# Altium footprint library Hare_Library.PcbLib: 252 footprints (part 10 of 16)
Each footprint in its own frame and in the unit in brackets; x right, y up, seen from the top. Pads: shape width x height; smd on the part's side, far side on the other; paste and mask are expansions set on the pad; w line width, h text height; cw(c..) or ccw(c..) is an arc to the next point about the centre after c.
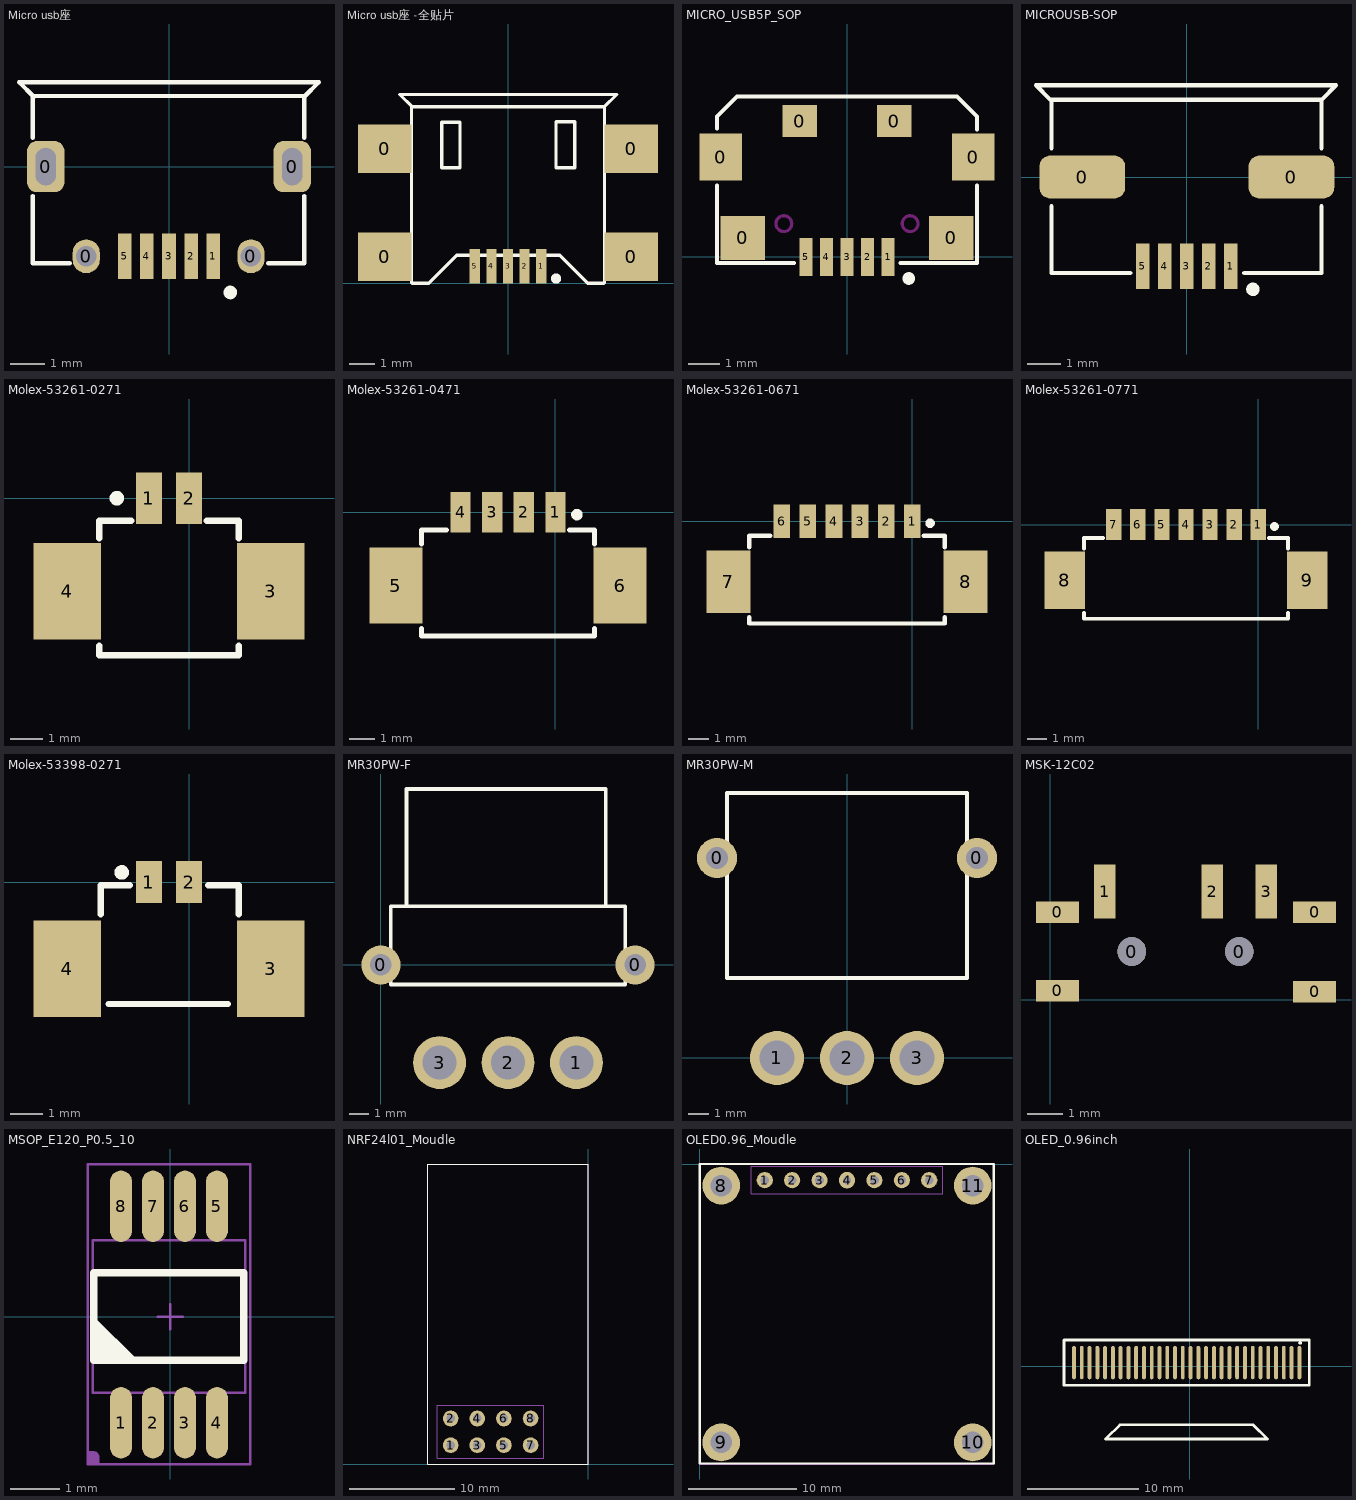
[diagram p9: the footprints below, top view; thin cyan lines are the x and y axes]

## Micro usb座 [mm] "Micro usb座 5pin"
pads (9):
  rrect50% 1.1x1.5 hole 0.6 slot 1.1 at 90 deg: 0(-3.632,0) 0(3.632,0)
  oval 0.8x1 hole 0.6: 0(-2.438,-2.642) 0(2.413,-2.642)
  rect 0.4x1.35 smd: 1(1.3,-2.642) 2(0.65,-2.642) 3(0,-2.642) 4(-0.65,-2.642) 5(-1.3,-2.642)
Top Overlay:
  circle w0.2: c1.805,-3.708 r0.1
  lines w0.127: -4.013,-0.864 -4.013,-2.845 -2.921,-2.845 ; -4.013,0.851 -4.013,2.083 -2.438,2.083 ; -3.988,2.057 -4.42,2.489 4.42,2.489 3.988,2.057 ; -3.988,2.083 3.988,2.083 3.988,0.851 ; 2.921,-2.845 3.988,-2.845 3.988,-0.864

## Micro usb座 -全贴片 [mm]
pads (9):
  rect 2.1x1.9 smd: 0(-4.826,1.041) 0(-4.826,5.258) 0(4.826,1.041) 0(4.826,5.258)
  rect 0.4x1.35 smd: 1(1.3,0.66) 2(0.65,0.66) 3(0,0.66) 4(-0.65,0.66) 5(-1.3,0.66)
Top Overlay:
  circle w0.2: c1.881,0.178 r0.1
  lines w0.127: -3.759,6.909 -4.242,7.391 4.267,7.391 3.759,6.883 ; -3.785,0.025 -3.785,6.909 3.785,6.909 3.785,0.025 3.759,0 3.124,0 2.032,1.092 -2.007,1.092 -3.099,0 -3.124,0 -3.759,0 -3.785,0.025 ; -2.591,4.521 -1.88,4.521 -1.88,6.299 -2.591,6.299 -2.591,4.521 ; 1.88,4.521 1.88,6.325 2.616,6.325 2.616,4.521 1.88,4.521

## MICRO_USB5P_SOP [mm]
pads (11):
  rect 1.35x1.5 smd: 0(-4,3.16) 0(4,3.16)
  rect 1.4x1.4 smd: 0(-3.3,0.6) 0(3.3,0.6)
  rect 1.1x1 smd: 0(-1.5,4.3) 0(1.5,4.3)
  rect 0.4x1.2 smd: 1(1.3,0) 2(0.65,0) 3(0,0) 4(-0.65,0) 5(-1.3,0)
Top Overlay:
  circle w0.2: c1.957,-0.686 r0.1
  lines w0.127: -4.115,2.261 -4.115,-0.203 -1.676,-0.203 ; -4.115,4.064 -4.115,4.445 -3.48,5.08 3.48,5.08 4.115,4.445 4.115,4.039 ; 1.702,-0.203 4.115,-0.203 4.115,2.261
Keep-Out Layer:
  circle w0.1: c-2,1.05 r0.25
  circle w0.1: c2,1.05 r0.25

## MICROUSB-SOP [mm]
pads (7):
  rrect50% 2.54x1.27 smd: 0(-3.099,0) 0(3.099,0)
  rect 0.4x1.35 smd: 1(1.3,-2.642) 2(0.65,-2.642) 3(0,-2.642) 4(-0.65,-2.642) 5(-1.3,-2.642)
Top Overlay:
  circle w0.2: c1.957,-3.327 r0.1
  lines w0.127: -4.013,-0.864 -4.013,-2.845 -1.676,-2.845 ; -4.013,0.851 -4.013,2.286 ; 1.702,-2.845 3.988,-2.845 3.988,-0.864 ; 3.988,0.851 3.988,2.286 ; 3.988,2.286 -4.039,2.286 -4.47,2.718 4.42,2.718 3.988,2.286

## Molex-53261-0271 [mm] "卧式1.25mm Pitch PicoBlade Header"
height 3.4
pads (4):
  rect 0.8x1.6 smd: 1(-1.25,0) 2(0,0)
  rect 2.1x3 smd: 3(2.55,-2.9) 4(-3.8,-2.9)
Top Overlay:
  circle w0.254: c-2.25,0 r0.1
  lines w0.2: -2.8,-4.6 -2.8,-4.9 1.55,-4.9 1.55,-4.6 ; -2.8,-1.25 -2.8,-0.7 -1.8,-0.7 ; 0.55,-0.7 1.55,-0.7 1.55,-1.25
3D body "MOLEX-53261-0271.stp": height 3.4, standoff 0, extent -4.46,-4.912 3.19,0.288

## Molex-53261-0471 [mm] "卧式1.25mm Pitch PicoBlade Header"
height 3.4
pads (6):
  rect 0.8x1.6 smd: 1(0,0) 2(-1.25,0) 3(-2.5,0) 4(-3.75,0)
  rect 2.1x3 smd: 5(-6.3,-2.9) 6(2.55,-2.9)
Top Overlay:
  circle w0.254: c0.85,-0.1 r0.1
  lines w0.2: -5.3,-4.6 -5.3,-4.9 1.55,-4.9 1.55,-4.6 ; -5.3,-1.25 -5.3,-0.7 -4.3,-0.7 ; 0.55,-0.7 1.55,-0.7 1.55,-1.25
3D body "MOLEX-53261-0471.stp": height 3.4, standoff 0, extent -6.975,-4.975 3.175,0.225

## Molex-53261-0671 [mm] "卧式1.25mm Pitch PicoBlade Header"
height 3.4
pads (8):
  rect 0.8x1.6 smd: 1(0,0) 2(-1.25,0) 3(-2.5,0) 4(-3.75,0) 5(-5,0) 6(-6.25,0)
  rect 2.1x3 smd: 7(-8.8,-2.9) 8(2.55,-2.9)
Top Overlay:
  circle w0.254: c0.85,-0.1 r0.1
  lines w0.2: -7.8,-4.6 -7.8,-4.9 1.55,-4.9 1.55,-4.6 ; -7.8,-1.25 -7.8,-0.7 -6.8,-0.7 ; 0.55,-0.7 1.55,-0.7 1.55,-1.25
3D body "MOLEX-53261-0671.stp": height 3.4, standoff 0, extent -9.449,-4.937 3.201,0.263

## Molex-53261-0771 [mm] "卧式1.25mm Pitch PicoBlade Header"
height 3.4
pads (9):
  rect 0.8x1.6 smd: 1(0,0) 2(-1.25,0) 3(-2.5,0) 4(-3.75,0) 5(-5,0) 6(-6.25,0) 7(-7.5,0)
  rect 2.1x3 smd: 8(-10.05,-2.9) 9(2.55,-2.9)
Top Overlay:
  circle w0.254: c0.85,-0.1 r0.1
  lines w0.2: -9.05,-4.6 -9.05,-4.9 1.55,-4.9 1.55,-4.6 ; -9.05,-1.25 -9.05,-0.7 -8.05,-0.7 ; 0.55,-0.7 1.55,-0.7 1.55,-1.25
3D body "MOLEX-53261-0771.stp": height 3.4, standoff 0, extent -10.7,-4.975 3.2,0.225

## Molex-53398-0271 [mm] "立式1.25mm Pitch PicoBlade Header"
height 3.4
pads (4):
  rect 0.8x1.3 smd: 1(-1.25,0) 2(0,0)
  rect 2.1x3 smd: 3(2.55,-2.7) 4(-3.8,-2.7)
Top Overlay:
  circle w0.254: c-2.1,0.3 r0.1
  lines w0.2: -2.75,-1 -2.75,-0.1 -1.85,-0.1 ; -2.5,-3.8 1.2,-3.8 ; 0.6,-0.1 1.55,-0.1 1.55,-1
3D body "MOLEX-53398-0271.stp": height 4.67, standoff -0.07, extent -4.425,-3.8 3.225,0.4

## MR30PW-F [mm]
pads (5):
  round 2 hole 1.1: 0(0,0) 0(13,0)
  round 2.7 hole 1.75: 1(10,-5) 2(6.5,-5) 3(3,-5)
Top Overlay:
  lines w0.2: 1.3,3 1.3,9 11.5,9 11.5,3 ; 0.5,-1 12.5,-1 12.5,3 0.5,3 0.5,-1
3D body "MR30PW-F 3D DRAWING.STEP": height 4.9, standoff -2.05, extent -1.15,-5.952 14.15,8.948

## MR30PW-M [mm]
pads (5):
  round 2 hole 1.1: 0(-6.5,10) 0(6.5,10)
  round 2.7 hole 1.75: 1(-3.5,0) 2(0,0) 3(3.5,0)
Top Overlay:
  lines w0.2: -6,4 6,4 6,13.25 -6,13.25 -6,4
3D body "MR30PW-M 3D DRAWING.STEP": height 4.9, standoff -2.05, extent -7.65,-0.85 7.65,13.1

## MSK-12C02 [mm]
pads (9):
  rect 1.2x0.6 smd: 0(0.2,0.25) 0(0.2,2.45) 0(7.375,0.225) 0(7.375,2.45)
  round 0.8 hole 0.8 unplated: 0(2.275,1.35) 0(5.275,1.35)
  rect 0.6x1.5 smd: 1(1.525,3.025) 2(4.525,3.025) 3(6.025,3.025)
3D body "MSK-12C02.STEP": height 1.18, standoff -0.48, extent -0.075,-1.45 7.625,3.55

## MSOP_E120_P0.5_10 [mm]
height 1.1
pads (8):
  oval 0.45x1.45 smd: 1(-1,-2.159) 2(-0.35,-2.159) 3(0.3,-2.159) 4(0.95,-2.159) 5(0.95,2.241) 6(0.3,2.241) 7(-0.35,2.241) 8(-1,2.241)
Top Overlay:
  region: -1.549,-0.889 -1.549,0 -0.66,-0.889
  lines w0.152: -1.549,-0.889 1.499,-0.889 1.499,0.889 -1.549,0.889 -1.549,-0.889
Mechanical 13:
  lines w0.051: -0.254,0 0.254,0 ; 0,-0.254 0,0.254 ; -1.575,-1.55 -1.575,1.55 1.525,1.55 1.525,-1.55 -1.575,-1.55
Mechanical 14:
  region: -1.7,-2.988 -1.7,-2.734 -1.573,-2.734 -1.548,-2.734 -1.501,-2.753 -1.465,-2.789 -1.446,-2.835 -1.446,-2.861 -1.446,-2.988
  lines w0.051: -1.676,-2.997 1.626,-2.997 1.626,3.099 -1.676,3.099 -1.676,-2.997
3D body "DGK0008A.stp": height 0.97, standoff 0, extent -1.524,-2.451 1.473,2.451

## NRF24l01_Moudle [mm]
height 4.3
pads (8):
  round 1.5 hole 0.813: 1(-13.12,1.8) 2(-13.12,4.34) 3(-10.58,1.8) 4(-10.58,4.34) 5(-8.04,1.8) 6(-8.04,4.34) 7(-5.5,1.8) 8(-5.5,4.34)
Top Overlay:
  lines w0.1: -15.3,0 -15.3,28.6 0,28.6 0,0 -15.3,0
Mechanical 13:
  lines w0.051: -14.39,0.53 -4.23,0.53 -4.23,5.61 -14.39,5.61 -14.39,0.53
Mechanical 14:
  lines w0.051: -14.39,0.53 -14.39,5.61 -4.23,5.61 -4.23,0.53 -14.39,0.53
  lines w0.1: -15.3,0 -15.3,28.6 0,28.6 0,0 -15.3,0

## OLED0.96_Moudle [mm]
pads (11):
  round 1.5 hole 0.813: 1(6.03,-1.5) 2(8.57,-1.5) 3(11.11,-1.5) 5(16.19,-1.5) 6(18.73,-1.5) 7(21.27,-1.5)
  round 1.524 hole 0.762: 4(13.65,-1.5)
  round 3.5 hole 2: 8(2,-2) 9(2,-25.8) 10(25.3,-25.8) 11(25.3,-2)
Top Overlay:
  lines w0.2: 0,-27.75 0,0 27.25,0 27.25,-27.75 0,-27.75
Mechanical 13:
  lines w0.051: 4.76,-2.77 22.53,-2.77 22.53,-0.23 4.76,-0.23 4.76,-2.77
Mechanical 14:
  lines w0.051: 0,-27.8 0,0 27.3,0 27.3,-27.8 0,-27.8 ; 4.76,-2.77 4.76,-0.23 22.53,-0.23 22.53,-2.77 4.76,-2.77

## OLED_0.96inch [mm]
pads (30):
  oval 0.35x3 smd: 1(9.889,0.32) 2(9.189,0.32) 3(8.489,0.32) 4(7.789,0.32) 5(7.089,0.32) 6(6.389,0.32) 7(5.689,0.32) 8(4.989,0.32) 9(4.289,0.32) 10(3.589,0.32) 11(2.889,0.32) 12(2.189,0.32) 13(1.489,0.32) 14(0.789,0.32) 15(0.089,0.32) 16(-0.611,0.32) 17(-1.311,0.32) 18(-2.011,0.32) 19(-2.711,0.32) 20(-3.411,0.32) 21(-4.111,0.32) 22(-4.811,0.32) 23(-5.511,0.32) 24(-6.211,0.32) 25(-6.911,0.32) 26(-7.611,0.32) 27(-8.311,0.32) 28(-9.011,0.32) 29(-9.711,0.32) 30(-10.411,0.32)
Top Overlay:
  lines w0.254: -7.561,-6.564 7.018,-6.564 5.738,-5.283 -6.28,-5.283 -7.469,-6.472 ; 9.889,2.098 10.016,2.098 ; -11.32,-1.712 -11.32,2.352 10.778,2.352 10.778,-1.712 -11.32,-1.712
Bottom Overlay:
  lines w0.254: -13.835,-1.586 -13.835,15.966 -12.641,15.966 -8.145,15.966 ; -13.81,-1.611 13.165,-1.611 ; 7.476,15.966 13.165,15.966 ; 13.191,-1.636 13.191,15.94
  text "0.96'OLED" at 2.21,15.342 h1.27
3D body "User Library-096OLED.SLDPRT": height 1.44, standoff -2.4, extent -13.579,-6.165 13.121,16.052